# Altium footprint library MinervaBots.PcbLib: 162 footprints (part 3 of 11)
Each footprint in its own frame and in the unit in brackets; x right, y up, seen from the top. Pads: shape width x height; smd on the part's side, far side on the other; paste and mask are expansions set on the pad; w line width, h text height; cw(c..) or ccw(c..) is an arc to the next point about the centre after c.
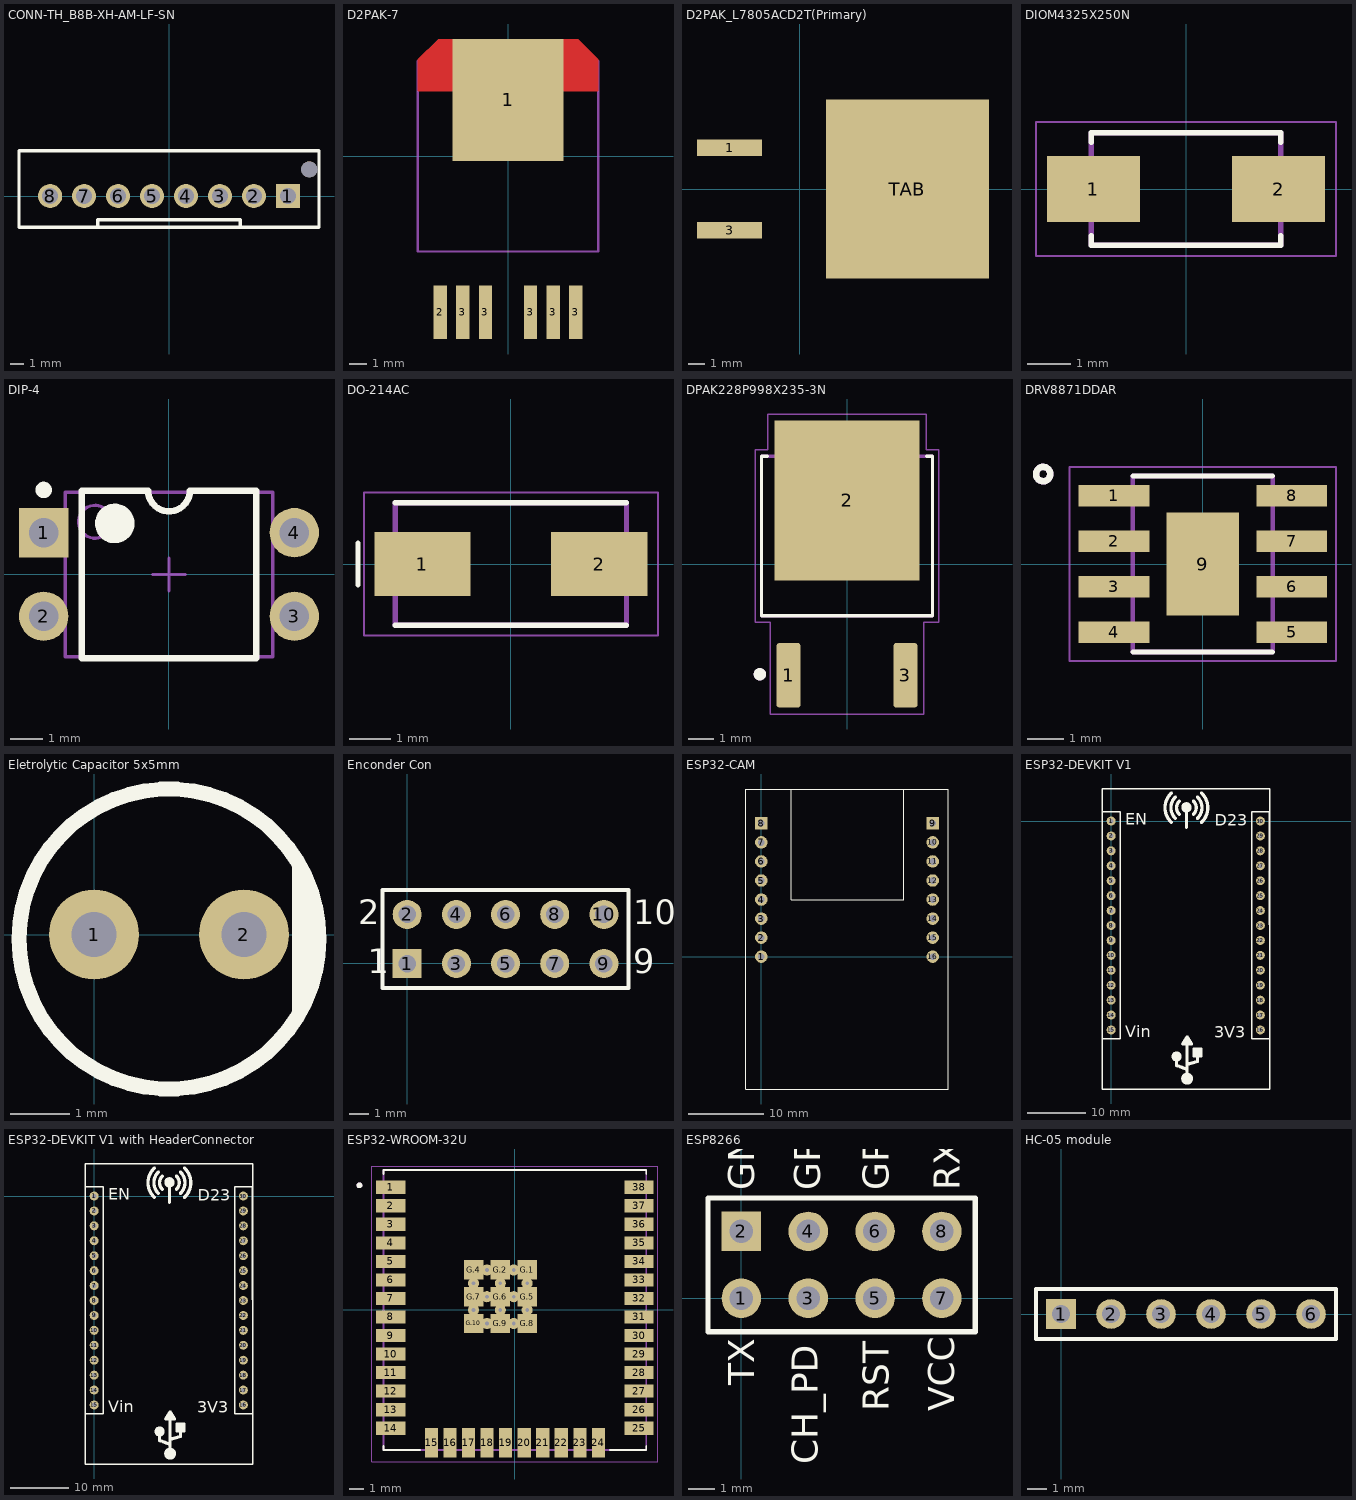
[diagram p2: the footprints below, top view; thin cyan lines are the x and y axes]

## CONN-TH_B8B-XH-AM-LF-SN [mm]
pads (9):
  rect 1.8x1.8 hole 1.2: 1(8.89,0)
  round 1.8 hole 1.2: 2(6.35,0) 3(3.81,0) 4(1.27,0) 5(-1.27,0) 6(-3.81,0) 7(-6.35,0) 8(-8.89,0)
  round 1.2 hole 1.2 unplated: ""(10.49,2)
Top Overlay:
  lines w0.254: -5.334,-2.286 -5.334,-1.778 5.334,-1.778 5.334,-2.286 ; -11.22,-2.35 11.22,-2.35 11.22,3.4 -11.22,3.4 -11.22,-2.35
Top Designator:
  text ".Designator" at -7.618,0.017 h1.52

## D2PAK-7 [mm]
pads (7):
  rect 6.22x6.86 smd: 1(0,3.175)
  rect 0.75x3 smd: 2(-3.812,-8.773) 3(-2.542,-8.773) 3(-1.272,-8.773) 3(1.268,-8.773) 3(2.538,-8.773) 3(3.808,-8.773)
Top Layer:
  region: -3.937,6.604 -5.082,5.459 -5.082,3.668 5.078,3.668 5.079,5.463 3.937,6.604
Mechanical 1:
  lines w0.127: -5.081,-5.348 5.079,-5.348 5.079,5.347 -5.081,5.347 -5.081,-5.348
Top Designator:
  text ".Designator" at -7.617,-2.342 h1.52
3D body "User Library-D2PAK-7.STEP": height 4.5, standoff 0, extent -5.2,-9.702 5.2,5.972

## D2PAK_L7805ACD2T(Primary) [mil]
pads (3):
  rect 157.48x40 smd: 1(-170,100) 3(-170,-100)
  rect 393.7x433.07 smd: TAB(260,0)
Top Designator:
  text ".Designator" at -195.85,-19.99 h60
3D body "69319.stp": height 177.17, standoff 0, extent -189.69,-198.82 416.22,198.82

## DIOM4325X250N [mm]
pads (2):
  rect 2.12x1.5 smd: 1(-2.115,0) 2(2.115,0)
Top Overlay:
  lines w0.127: -2.165,-1.07 -2.165,-1.28 2.165,-1.28 2.165,-1.07 ; -2.165,1.07 -2.165,1.28 2.165,1.28 2.165,1.07
Top Designator:
  text ".Designator" at -7.618,-0.508 h1.52
Mechanical 13:
  lines w0.127: -2.165,-1.28 2.165,-1.28 2.165,1.28 -2.165,1.28 -2.165,-1.28
Mechanical 15:
  lines w0.05: -3.425,-1.53 3.425,-1.53 3.425,1.53 -3.425,1.53 -3.425,-1.53

## DIP-4 [mm]
pads (4):
  rect 1.5x1.5 hole 0.9: 1(-3.81,1.27)
  round 1.5 hole 0.9: 2(-3.81,-1.27) 3(3.81,-1.27) 4(3.81,1.27)
Top Overlay:
  circle w0.6: c-1.65,1.55 r0.3
  circle w0.25: c-3.81,2.57 r0.125
  lines w0.2: -2.65,-2.55 2.65,-2.55 2.65,2.55 0.635,2.55 cw(c0,2.55) -0.635,2.55 -2.65,2.55 -2.65,-2.55
Top Designator:
  text ".Designator" at -7.618,-0.603 h1.52
Mechanical 13:
  circle w0.1: c-2.25,1.6 r0.5
  lines w0.1: -3.15,-2.5 3.15,-2.5 3.15,2.5 -3.15,2.5 -3.15,-2.5
Mechanical 15:
  lines w0.1: -0.5,0 0.5,0 ; 0,-0.5 0,0.5
3D body "DS1040-02 (DIP_switch).stp": height 6.8, standoff -3.85, extent -4.95,-3.365 4.95,3.175

## DO-214AC [mm]
pads (2):
  rect 2.33x1.56 smd: 1(-2.14,0) 2(2.14,0)
Top Overlay:
  lines w0.127: -3.7,-0.5 -3.7,0.5 ; -2.8,-1.48 2.8,-1.48 ; -2.8,1.48 2.8,1.48
Top Designator:
  text ".Designator" at -7.707,-0.508 h1.52
Mechanical 13:
  lines w0.127: -2.8,-1.48 2.8,-1.48 2.8,1.48 -2.8,1.48 -2.8,-1.48
Mechanical 15:
  lines w0.05: -3.56,-1.73 3.56,-1.73 3.56,1.73 -3.56,1.73 -3.56,-1.73

## DPAK228P998X235-3N [mm]
pads (3):
  rrect25% 0.94x2.52 smd: 1(-2.28,-4.34) 3(2.28,-4.34)
  rect 5.67x6.23 smd paste-4: 2(0,2.48)
Top Overlay:
  circle w0.24: c-3.4,-4.3 r0.12
  lines w0.127: -3.1,4.2 -3.33,4.2 -3.33,-2.02 3.33,-2.02 3.33,4.2 3.1,4.2
Top Paste:
  region: 0.655,1.73 -0.655,1.73 -0.655,3.23 0.655,3.23
  region: 0.655,3.81 -0.655,3.81 -0.655,5.31 0.655,5.31
  region: 0.655,-0.35 -0.655,-0.35 -0.655,1.15 0.655,1.15
  region: -1.235,3.81 -2.545,3.81 -2.545,5.31 -1.235,5.31
  region: 2.545,3.81 1.235,3.81 1.235,5.31 2.545,5.31
  region: 2.545,1.73 1.235,1.73 1.235,3.23 2.545,3.23
  region: -1.235,1.73 -2.545,1.73 -2.545,3.23 -1.235,3.23
  region: 2.545,-0.35 1.235,-0.35 1.235,1.15 2.545,1.15
  region: -1.235,-0.35 -2.545,-0.35 -2.545,1.15 -1.235,1.15
Top Designator:
  text ".Designator" at -7.635,-0.508 h1.52
Mechanical 13:
  circle w0.24: c-3.4,-4.3 r0.12
  lines w0.127: -3.33,-2.02 3.33,-2.02 3.33,4.2 -3.33,4.2 -3.33,-2.02
Mechanical 15:
  lines w0.05: -3.58,-2.27 -3,-2.27 -3,-5.85 3,-5.85 3,-2.27 3.58,-2.27 3.58,4.45 3.09,4.45 3.09,5.85 -3.09,5.85 -3.09,4.45 -3.58,4.45 -3.58,-2.27
3D body "IPD50P04P4L-11--3DModel-STEP-56544.STEP": height 2.49, standoff -0.01, extent -3.275,-5.097 3.225,4.883

## DRV8871DDAR [mm]
pads (9):
  rect 1.97x0.6 smd: 1(-2.475,1.905) 2(-2.475,0.635) 3(-2.475,-0.635) 4(-2.475,-1.905) 5(2.475,-1.905) 6(2.475,-0.635) 7(2.475,0.635) 8(2.475,1.905)
  rect 2.02x2.87 smd: 9(0,0)
Top Overlay:
  circle w0.18: c-4.445,2.505 r0.2
  lines w0.127: -1.95,-2.45 1.95,-2.45 ; -1.95,2.45 1.95,2.45
Top Paste:
  region: 0.785,-1.205 0.115,-1.205 0.115,-0.115 0.785,-0.115
  region: -0.115,-1.205 -0.785,-1.205 -0.785,-0.115 -0.115,-0.115
  region: -0.785,1.205 -0.115,1.205 -0.115,0.115 -0.785,0.115
  region: 0.115,1.205 0.785,1.205 0.785,0.115 0.115,0.115
Top Designator:
  text ".Designator" at -8.118,-0.473 h1.52
Mechanical 4:
  circle w0.18: c-4.445,2.505 r0.2
  circle w0.18: c-4.445,2.505 r0.2
  lines w0.127: -1.95,-2.45 -1.95,2.45 ; -1.95,-2.45 1.95,-2.45 ; -1.95,-2.45 -1.95,2.45 ; -1.95,-2.45 1.95,-2.45 ; -1.95,2.45 1.95,2.45 ; -1.95,2.45 1.95,2.45 ; 1.95,-2.45 1.95,2.45 ; 1.95,-2.45 1.95,2.45
Mechanical 16:
  lines w0.05: -3.71,-2.7 -3.71,2.7 3.71,2.7 3.71,-2.7 -3.71,-2.7
3D body "DRV8841.STEP": height 1.55, standoff -0.05, extent -3.021,-2.5 3.021,2.52

## Eletrolytic Capacitor 5x5mm [mil]
pads (2):
  round 60 hole 30: 1(0,0) 2(100,0)
Top Overlay:
  circle w10: c50,-3 r100
  lines w10: 137,-52 137,45 ; 142,27 142,-30 143,-31
Top Designator:
  text ".Designator" at -249.9,-22.99 h60
3D body "Electrolytic Capacitor Radial 5x12.step": height 519.68, standoff -74.8, extent -50,-99 150,100.82

## Enconder Con [mm]
pads (10):
  rect 1.5x1.5 hole 0.9: 1(0,-0.025)
  round 1.5 hole 0.9: 2(0,2.515) 3(2.54,-0.025) 4(2.54,2.515) 5(5.08,-0.025) 6(5.08,2.515) 7(7.62,-0.025) 8(7.62,2.515) 9(10.16,-0.025) 10(10.16,2.515)
Top Overlay:
  lines w0.2: -1.27,-1.295 -1.27,3.785 11.43,3.785 11.43,-1.295 -1.27,-1.295
  text "2" at -2.54,2.007 h1.27
  text "1" at -2.032,-0.533 h1.27
  text "9" at 11.684,-0.533 h1.27
  text "10" at 11.684,2.007 h1.27
Top Designator:
  text ".Designator" at -2.618,5.675 h1.52
3D body "DS1013-10R (IDC-10R CONNFLY).stp": height 8.9, standoff -3, extent -5.25,-0.26 15.25,13.76

## ESP32-CAM [mm]
pads (16):
  round 1.665 hole 0.9: 1(0,0) 2(0,2.54) 3(0,5.08) 4(0,7.62) 5(0,10.16) 6(0,12.7) 7(0,15.24) 10(22.86,15.24) 11(22.86,12.7) 12(22.86,10.16) 13(22.86,7.62) 14(22.86,5.08) 15(22.86,2.54) 16(22.86,0)
  rect 1.665x1.665 hole 0.9: 8(0,17.78) 9(22.86,17.78)
Top Overlay:
  lines w0.1: 4,22.36 4,7.62 19,7.62 19,22.36 ; -2.07,-17.64 -2.07,22.36 24.93,22.36 24.93,-17.64 -2.07,-17.64
Top Designator:
  text ".Designator" at 3.797,1.947 h1.52
Mechanical 13:
  text "CAM" at 11.43,9 h1.27
3D body "User Library-020_002 - ESP32-CAM - MODELO.STEP": height 10.5, standoff -5.5, extent -2.15,-16.4 24.85,22.6

## ESP32-DEVKIT V1 [mil] "Módulo ESP32 com 30 pinos e componente 3D"
pads (30):
  round 60 hole 30: 1(0,0) 2(0,-100) 3(0,-200) 4(0,-300) 5(0,-400) 6(0,-500) 7(0,-600) 8(0,-700) 9(0,-800) 10(0,-900) 11(0,-1000) 12(0,-1100) 13(0,-1200) 14(0,-1300) 15(0,-1400) 16(1000,-1400) 17(1000,-1300) 18(1000,-1200) 19(1000,-1100) 20(1000,-1000) 21(1000,-900) 22(1000,-800) 23(1000,-700) 24(1000,-600) 25(1000,-500) 26(1000,-400) 27(1000,-300) 28(1000,-200) 29(1000,-100) 30(1000,0)
Top Overlay:
  drawing of 20 lines, arcs and shapes, not listed
  text "EN" at 94.79,-23.39 h78.74
  text "D23" at 693.79,-31.39 h78.74
  text "3V3" at 691.79,-1452.62 h78.74
  text "Vin" at 93.79,-1447.39 h78.74
Top Designator:
  text ".Designator" at 201.87,-810.39 h60
3D body "ESP-WROOM32.STEP": height 267.72, standoff -220.47, extent -60.04,-1789.96 1062.01,215.16

## ESP32-DEVKIT V1 with HeaderConnector [mil] "Módulo ESP32 com 30 pinos e componente 3D com suporte de headers"
pads (30):
  round 60 hole 30: 1(0,0) 2(0,-100) 3(0,-200) 4(0,-300) 5(0,-400) 6(0,-500) 7(0,-600) 8(0,-700) 9(0,-800) 10(0,-900) 11(0,-1000) 12(0,-1100) 13(0,-1200) 14(0,-1300) 15(0,-1400) 16(1000,-1400) 17(1000,-1300) 18(1000,-1200) 19(1000,-1100) 20(1000,-1000) 21(1000,-900) 22(1000,-800) 23(1000,-700) 24(1000,-600) 25(1000,-500) 26(1000,-400) 27(1000,-300) 28(1000,-200) 29(1000,-100) 30(1000,0)
Top Overlay:
  drawing of 20 lines, arcs and shapes, not listed
  text "EN" at 94.79,-23.39 h78.74
  text "D23" at 693.79,-31.39 h78.74
  text "3V3" at 691.79,-1452.62 h78.74
  text "Vin" at 93.79,-1447.39 h78.74
Top Designator:
  text ".Designator" at 201.87,-810.39 h60
3D body "ESP-WROOM32.STEP": height 604.13, standoff 115.94, extent -60.04,-1789.96 1062.01,215.16
3D body "Female Pin Header 01x15 Pitch 2.54mm Height 8.5mm.stp": height 334.65, standoff -125.98, extent -50,-1450 50,50
3D body "Female Pin Header 01x15 Pitch 2.54mm Height 8.5mm.stp": height 334.65, standoff -125.98, extent 950,-1450 1050,50

## ESP32-WROOM-32U [mm]
height 3.3
pads (59):
  rect 2x0.9 smd: 1(-8.5,8.41) 2(-8.5,7.14) 3(-8.5,5.87) 4(-8.5,4.6) 5(-8.5,3.33) 6(-8.5,2.06) 7(-8.5,0.79) 8(-8.5,-0.48) 9(-8.5,-1.75) 10(-8.5,-3.02) 11(-8.5,-4.29) 12(-8.5,-5.56) 13(-8.5,-6.83) 14(-8.5,-8.1) 25(8.5,-8.1) 26(8.5,-6.83) 27(8.5,-5.56) 28(8.5,-4.29) 29(8.5,-3.02) 30(8.5,-1.75) 31(8.5,-0.48) 32(8.5,0.79) 33(8.5,2.06) 34(8.5,3.33) 35(8.5,4.6) 36(8.5,5.87) 37(8.5,7.14) 38(8.5,8.41)
  rect 0.9x2 smd: 15(-5.715,-9.1) 16(-4.445,-9.1) 17(-3.175,-9.1) 18(-1.905,-9.1) 19(-0.635,-9.1) 20(0.635,-9.1) 21(1.905,-9.1) 22(3.175,-9.1) 23(4.445,-9.1) 24(5.715,-9.1)
  rect 1.33x1.33 smd: G.1(0.835,2.745) G.2(-1,2.745) G.4(-2.835,2.745) G.5(0.835,0.91) G.6(-1,0.91) G.7(-2.835,0.91) G.8(0.835,-0.925) G.9(-1,-0.925) G.10(-2.835,-0.925)
  round 0.762 hole 0.254: G.11(-0.082,2.745) G.12(-1.917,2.745) G.13(0.835,1.827) G.14(-1,1.827) G.15(-2.835,1.827) G.16(-0.082,0.91) G.17(-1.917,0.91) G.18(0.835,-0.008) G.19(-1,-0.008) G.20(-2.835,-0.008) G.21(-0.082,-0.925) G.22(-1.917,-0.925)
Top Overlay:
  circle w0.2: c-10.65,8.54 r0.1
  lines w0.127: -9,-9.3 -9,-9.6 -6.49,-9.6 ; -9,9.3 -9,9.6 9,9.6 9,9.3 ; 6.49,-9.6 9,-9.6 9,-9.3
Top Designator:
  text ".Designator" at -8.13,-0.783 h1.52
Mechanical 13:
  circle w0.2: c-10.65,8.54 r0.1
  lines w0.127: -9,-9.6 9,-9.6 9,9.6 -9,9.6 -9,-9.6
Mechanical 15:
  lines w0.05: -9.8,-10.4 9.8,-10.4 9.8,9.85 -9.8,9.85 -9.8,-10.4
3D body "step_temp.STEP": height 3.3, standoff 0, extent -9,-9.6 9,9.6

## ESP8266 [mm] "Esp8266 module"
pads (8):
  round 1.5 hole 0.9: 1(0,0) 3(2.54,0) 4(2.54,2.54) 5(5.08,0) 6(5.08,2.54) 7(7.62,0) 8(7.62,2.54)
  rect 1.5x1.5 hole 0.9: 2(0,2.54)
Top Overlay:
  lines w0.2: -1.27,-1.27 -1.27,3.81 8.89,3.81 8.89,-1.27 -1.27,-1.27
  text "TX" at 0.5,-3.3 h1
  text "CH_PD" at 2.9,-6.3 h1
  text "RST" at 5.6,-4.3 h1
  text "VCC" at 8.1,-4.3 h1
  text "GND" at 0.5,4.1 h1
  text "GPIO_2" at 3,4.1 h1
  text "GPIO_0" at 5.6,4.1 h1
  text "RX" at 8.3,4.1 h1
Top Designator:
  text ".Designator" at -3.868,7.891 h1.52
3D body "Esp8266.step": height 5.88, standoff -5.8, extent -3.5,-1.5 11,23.3

## HC-05 module [mm] "Connector; Header; 6 Position"
pads (6):
  rect 1.5x1.5 hole 0.9: 1(0,0)
  round 1.5 hole 0.9: 2(2.54,0) 3(5.08,0) 4(7.62,0) 5(10.16,0) 6(12.7,0)
Top Overlay:
  lines w0.2: -1.27,-1.27 13.97,-1.27 13.97,1.27 -1.27,1.27 -1.27,-1.27
Top Designator:
  text ".Designator" at -1.298,16.982 h1.52
3D body "female_header_a-bl254-eg-g06d.stp": height 8.5, standoff -3.2, extent -1.25,-1.25 14.24,1.25
3D body "HC-SERIES.stp": height 14.81, standoff 3.38, extent -1.6,-1.25 14.1,36.35